# Altium footprint library SMDLibrary.PcbLib: 306 footprints (part 4 of 20)
Each footprint in its own frame and in the unit in brackets; x right, y up, seen from the top. Pads: shape width x height; smd on the part's side, far side on the other; paste and mask are expansions set on the pad; w line width, h text height; cw(c..) or ccw(c..) is an arc to the next point about the centre after c.
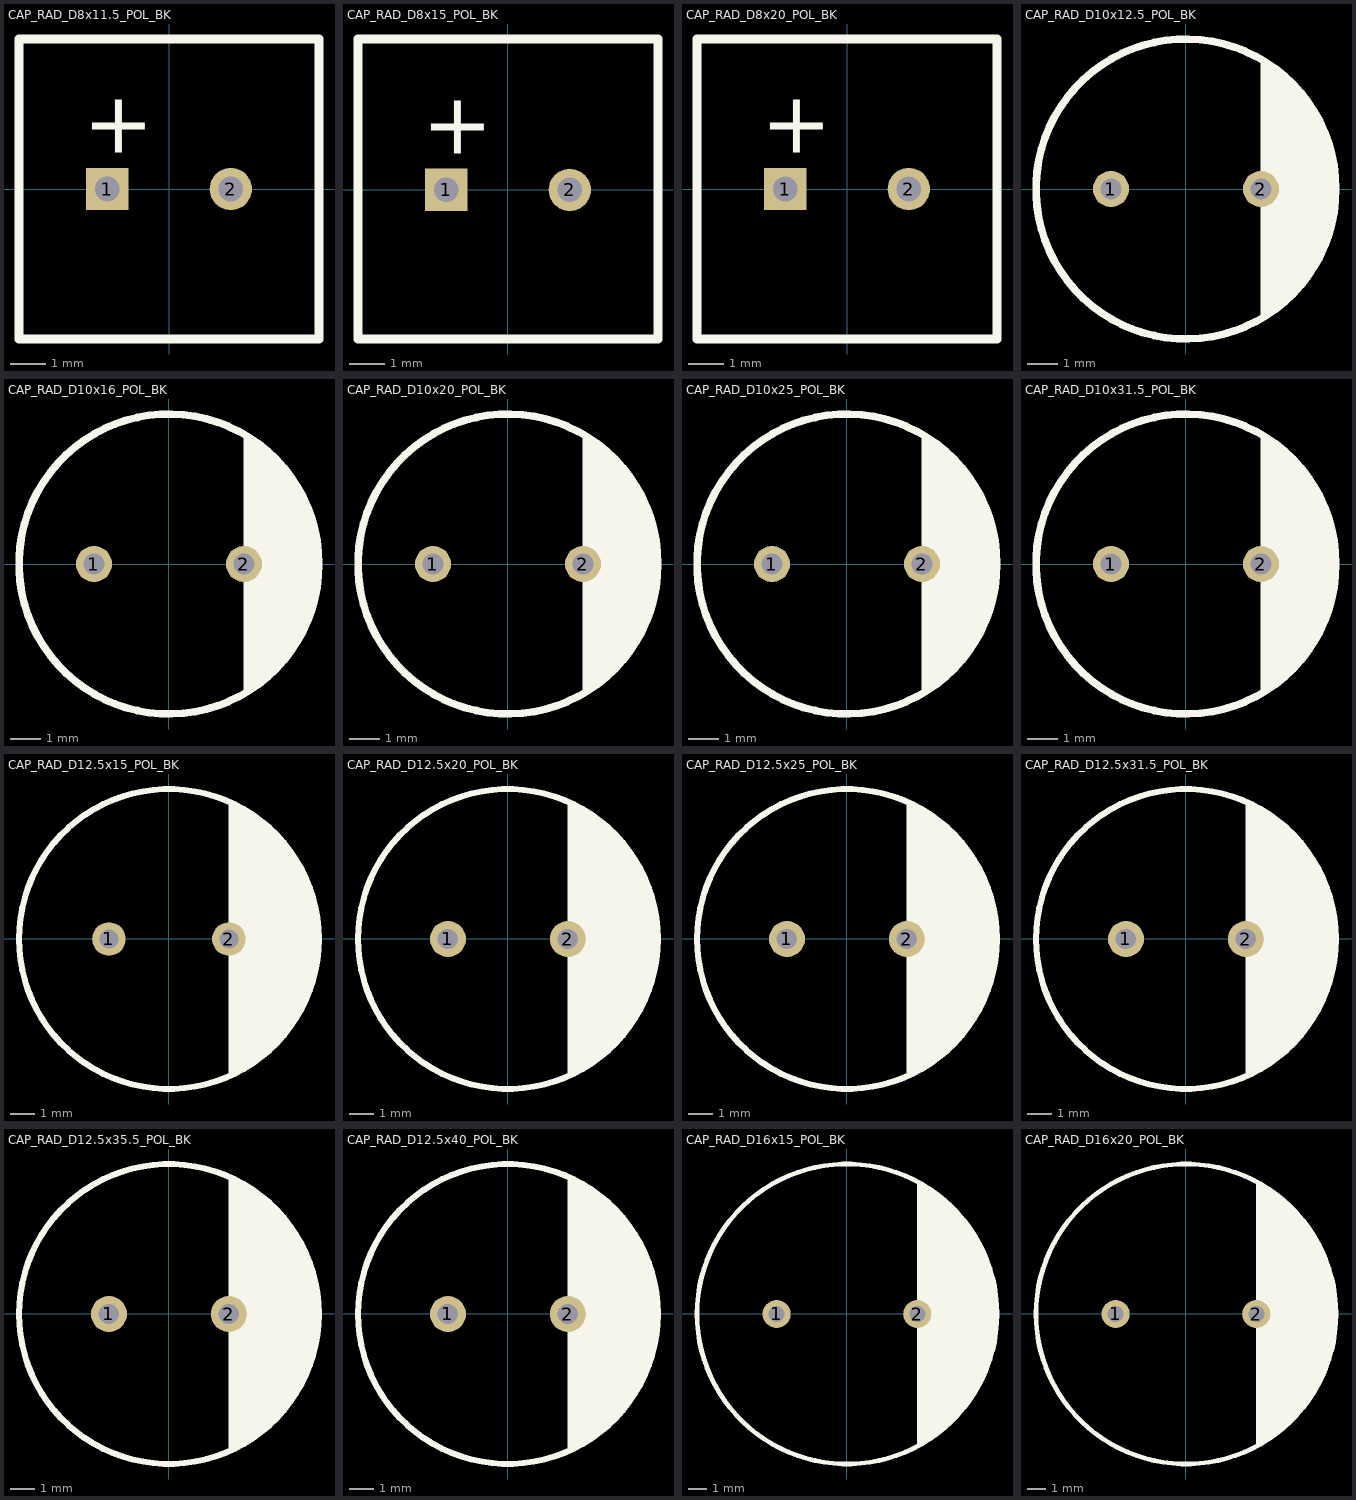
[diagram p3: the footprints below, top view; thin cyan lines are the x and y axes]

## CAP_RAD_D8x11.5_POL_BK [mm]
pads (2):
  rect 1.2x1.2 hole 0.7: 1(-1.75,0)
  round 1.2 hole 0.7: 2(1.75,0)
Top Overlay:
  region: 1.3,2.25
  lines w0.254: -4.25,-4.25 -4.25,4.25 4.25,4.25 4.25,-4.25 -4.25,-4.25
  text "+" at -2.425,0.45 h3
3D body "CAP_RAD_D8x11.5_POL_BK.stp": height 13, standoff -2.5, extent -4.25,-4.25 4.25,4.25

## CAP_RAD_D8x15_POL_BK [mm]
pads (2):
  rect 1.2x1.2 hole 0.7: 1(-1.75,0)
  round 1.2 hole 0.7: 2(1.75,0)
Top Overlay:
  region: 1.3,2.25
  lines w0.254: -4.25,-4.225 -4.25,4.275 4.25,4.275 4.25,-4.225 -4.25,-4.225
  text "+" at -2.425,0.45 h3
3D body "CAP_RAD_D8x15_POL_BK.stp": height 16.5, standoff -2.5, extent -4.25,-4.224 4.25,4.275

## CAP_RAD_D8x20_POL_BK [mm]
pads (2):
  rect 1.2x1.2 hole 0.7: 1(-1.75,0)
  round 1.2 hole 0.7: 2(1.75,0)
Top Overlay:
  region: 1.3,2.25
  lines w0.254: -4.25,-4.25 -4.25,4.25 4.25,4.25 4.25,-4.25 -4.25,-4.25
  text "+" at -2.425,0.45 h3
3D body "CAP_RAD_D8x20_POL_BK.stp": height 22, standoff -2.5, extent -4.25,-4.25 4.25,4.25

## CAP_RAD_D10x12.5_POL_BK [mm]
pads (2):
  round 1.2 hole 0.7: 1(-2.5,0) 2(2.5,0)
Top Overlay:
  circle w0.254: c0,0 r5
  region: 1.3,2.25
  region: 2.5,4.33 2.5,-4.299 2.78,-4.129 3.294,-3.721 3.752,-3.253 4.148,-2.73 4.475,-2.162 4.728,-1.557 4.903,-0.926 4.998,-0.277 5.004,0.051 4.995,0.374 4.897,1.015 4.72,1.637 4.466,2.233 4.139,2.792 3.744,3.305 3.288,3.765 2.778,4.164
3D body "CAP_RAD_D10x12.5_POL_BK.stp": height 14, standoff -2.5, extent -5.25,-5.247 5.25,5.248

## CAP_RAD_D10x16_POL_BK [mm]
pads (2):
  round 1.2 hole 0.7: 1(-2.5,0) 2(2.5,0)
Top Overlay:
  circle w0.254: c0,0 r5
  region: 2.5,4.33 2.5,-4.299 2.78,-4.129 3.294,-3.721 3.752,-3.253 4.148,-2.73 4.475,-2.162 4.728,-1.557 4.903,-0.926 4.998,-0.277 5.004,0.051 4.995,0.374 4.897,1.015 4.72,1.637 4.465,2.233 4.138,2.792 3.744,3.305 3.288,3.765 2.778,4.164
  region: 1.3,2.25
3D body "CAP_RAD_D10x16_POL_BK.stp": height 17.5, standoff -2.5, extent -5.25,-5.247 5.25,5.248

## CAP_RAD_D10x20_POL_BK [mm]
pads (2):
  round 1.2 hole 0.7: 1(-2.5,0) 2(2.5,0)
Top Overlay:
  circle w0.254: c0,0 r5
  region: 2.5,4.33 2.5,-4.299 2.78,-4.129 3.294,-3.721 3.752,-3.253 4.148,-2.73 4.475,-2.162 4.728,-1.557 4.903,-0.926 4.998,-0.277 5.004,0.051 4.995,0.374 4.897,1.015 4.72,1.637 4.465,2.233 4.138,2.792 3.744,3.305 3.288,3.765 2.778,4.164
  region: 1.3,2.25
3D body "CAP_RAD_D10x20_POL_BK.stp": height 22, standoff -2.5, extent -5.25,-5.247 5.25,5.248

## CAP_RAD_D10x25_POL_BK [mm]
pads (2):
  round 1.2 hole 0.7: 1(-2.5,0) 2(2.5,0)
Top Overlay:
  circle w0.254: c0,0 r5
  region: 1.3,2.25
  region: 2.5,4.33 2.5,-4.299 2.78,-4.129 3.294,-3.721 3.752,-3.253 4.148,-2.73 4.475,-2.162 4.728,-1.557 4.903,-0.926 4.998,-0.277 5.004,0.051 4.995,0.374 4.897,1.015 4.72,1.637 4.465,2.233 4.138,2.792 3.744,3.305 3.288,3.765 2.778,4.164
3D body "CAP_RAD_D10x25_POL_BK.stp": height 27, standoff -2.5, extent -5.25,-5.248 5.25,5.249

## CAP_RAD_D10x31.5_POL_BK [mm]
pads (2):
  round 1.2 hole 0.7: 1(-2.5,0) 2(2.5,0)
Top Overlay:
  circle w0.254: c0,0 r5
  region: 1.3,2.25
  region: 2.5,4.33 2.5,-4.299 2.78,-4.129 3.294,-3.721 3.752,-3.253 4.148,-2.73 4.475,-2.162 4.728,-1.557 4.903,-0.926 4.998,-0.277 5.004,0.051 4.995,0.374 4.897,1.015 4.72,1.637 4.465,2.233 4.138,2.792 3.744,3.305 3.288,3.765 2.778,4.164
3D body "CAP_RAD_D10x31.5_POL_BK.stp": height 33.5, standoff -2.5, extent -5.25,-5.247 5.25,5.247

## CAP_RAD_D12.5x15_POL_BK [mm]
pads (2):
  round 1.4 hole 0.8: 1(-2.5,0) 2(2.5,0)
Top Overlay:
  circle w0.254: c0,0 r6.25
  region: 2.5,5.74 2.5,-5.74 2.783,-5.627 3.322,-5.344 3.83,-5.008 4.3,-4.622 4.73,-4.19 5.113,-3.716 5.446,-3.206 5.725,-2.665 5.948,-2.098 6.112,-1.512 6.216,-0.912 6.258,-0.304 6.248,0 6.258,0.304 6.216,0.912 6.112,1.512 5.948,2.098 5.725,2.665 5.446,3.206 5.113,3.716 4.73,4.189 4.3,4.622 3.829,5.008 3.322,5.344 2.782,5.627
  region: 1.3,2.25
3D body "CAP_RAD_D12.5x15_POL_BK.stp": height 16.5, standoff -2.5, extent -6.5,-6.499 6.5,6.499

## CAP_RAD_D12.5x20_POL_BK [mm]
pads (2):
  round 1.5 hole 0.85: 1(-2.5,0) 2(2.5,0)
Top Overlay:
  circle w0.254: c0,0 r6.25
  region: 2.5,5.74 2.5,-5.74 2.783,-5.627 3.322,-5.344 3.83,-5.008 4.3,-4.622 4.73,-4.19 5.113,-3.716 5.446,-3.206 5.725,-2.665 5.948,-2.098 6.112,-1.512 6.216,-0.912 6.258,-0.304 6.248,0 6.258,0.304 6.216,0.912 6.112,1.512 5.948,2.098 5.725,2.665 5.446,3.206 5.113,3.716 4.73,4.189 4.3,4.622 3.829,5.008 3.322,5.344 2.782,5.627
  region: 1.3,2.25
3D body "CAP_RAD_D12.5x20_POL_BK.stp": height 22, standoff -2.5, extent -6.5,-6.499 6.5,6.499

## CAP_RAD_D12.5x25_POL_BK [mm]
pads (2):
  round 1.5 hole 0.85: 1(-2.5,0) 2(2.5,0)
Top Overlay:
  circle w0.254: c0,0 r6.25
  region: 1.3,2.25
  region: 2.5,5.74 2.5,-5.74 2.782,-5.627 3.322,-5.344 3.829,-5.008 4.3,-4.622 4.73,-4.19 5.113,-3.716 5.446,-3.206 5.725,-2.665 5.948,-2.098 6.112,-1.512 6.216,-0.912 6.258,-0.304 6.248,0 6.258,0.304 6.216,0.912 6.112,1.512 5.948,2.098 5.725,2.665 5.446,3.206 5.113,3.716 4.729,4.189 4.3,4.622 3.829,5.008 3.322,5.344 2.782,5.627
3D body "CAP_RAD_D12.5x25_POL_BK.stp": height 27, standoff -2.5, extent -6.5,-6.5 6.5,6.5

## CAP_RAD_D12.5x31.5_POL_BK [mm]
pads (2):
  round 1.5 hole 0.85: 1(-2.5,0) 2(2.5,0)
Top Overlay:
  circle w0.254: c0,0 r6.25
  region: 2.5,5.74 2.5,-5.74 2.782,-5.627 3.322,-5.344 3.829,-5.008 4.3,-4.622 4.73,-4.19 5.113,-3.716 5.446,-3.206 5.725,-2.665 5.948,-2.098 6.112,-1.512 6.216,-0.912 6.258,-0.304 6.248,0 6.258,0.304 6.216,0.912 6.112,1.512 5.948,2.098 5.725,2.665 5.446,3.206 5.113,3.716 4.729,4.189 4.3,4.622 3.829,5.008 3.322,5.344 2.782,5.627
  region: 1.3,2.25
3D body "CAP_RAD_D12.5x31.5_POL_BK.stp": height 33.5, standoff -2.5, extent -6.5,-6.498 6.5,6.499

## CAP_RAD_D12.5x35.5_POL_BK [mm]
pads (2):
  round 1.5 hole 0.85: 1(-2.5,0) 2(2.5,0)
Top Overlay:
  circle w0.254: c0,0 r6.25
  region: 1.3,2.25
  region: 2.5,5.74 2.5,-5.74 2.782,-5.627 3.322,-5.344 3.829,-5.008 4.3,-4.622 4.729,-4.19 5.112,-3.716 5.445,-3.206 5.725,-2.665 5.948,-2.098 6.112,-1.512 6.216,-0.912 6.258,-0.304 6.248,0 6.258,0.304 6.216,0.912 6.112,1.512 5.948,2.098 5.725,2.665 5.445,3.206 5.112,3.716 4.729,4.189 4.3,4.621 3.829,5.008 3.322,5.344 2.782,5.627
3D body "CAP_RAD_D12.5x35.5_POL_BK.stp": height 37.5, standoff -2.5, extent -6.5,-6.496 6.5,6.496

## CAP_RAD_D12.5x40_POL_BK [mm]
pads (2):
  round 1.5 hole 0.85: 1(-2.5,0) 2(2.5,0)
Top Overlay:
  circle w0.254: c0,0 r6.25
  region: 2.5,5.74 2.5,-5.74 2.782,-5.627 3.322,-5.344 3.829,-5.008 4.3,-4.622 4.729,-4.19 5.112,-3.716 5.445,-3.206 5.725,-2.665 5.948,-2.098 6.112,-1.512 6.216,-0.912 6.258,-0.304 6.248,0 6.258,0.304 6.216,0.912 6.112,1.512 5.948,2.098 5.725,2.665 5.445,3.206 5.112,3.716 4.729,4.189 4.3,4.621 3.829,5.008 3.322,5.344 2.782,5.627
  region: 1.3,2.25
3D body "CAP_RAD_D12.5x40_POL_BK.stp": height 42, standoff -2.5, extent -6.5,-6.496 6.5,6.496

## CAP_RAD_D16x15_POL_BK [mm]
pads (2):
  round 1.5 hole 0.85: 1(-3.75,0) 2(3.75,0)
Top Overlay:
  circle w0.254: c0,0 r8
  region: 3.75,7.094 3.75,-7.058 4.067,-6.882 4.669,-6.476 5.232,-6.019 5.754,-5.514 6.229,-4.965 6.653,-4.377 7.025,-3.753 7.34,-3.1 7.597,-2.421 7.793,-1.722 7.927,-1.009 7.997,-0.287 8.001,0.076 7.995,0.435 7.919,1.148 7.781,1.851 7.583,2.54 7.324,3.209 7.008,3.852 6.636,4.465 6.213,5.043 5.74,5.582 5.221,6.077 4.662,6.525 4.065,6.922
  region: 1.3,2.25
3D body "CAP_RAD_D16x15_POL_BK.stp": height 16.5, standoff -2.5, extent -8.25,-8.249 8.25,8.25

## CAP_RAD_D16x20_POL_BK [mm]
pads (2):
  round 1.5 hole 0.85: 1(-3.75,0) 2(3.75,0)
Top Overlay:
  circle w0.254: c0,0 r8
  region: 3.75,7.094 3.75,-7.058 4.067,-6.882 4.669,-6.476 5.232,-6.019 5.754,-5.514 6.229,-4.965 6.653,-4.377 7.025,-3.753 7.34,-3.1 7.597,-2.421 7.793,-1.722 7.927,-1.009 7.997,-0.287 8.001,0.076 7.995,0.435 7.919,1.148 7.781,1.851 7.583,2.54 7.324,3.209 7.008,3.852 6.636,4.465 6.213,5.043 5.74,5.582 5.221,6.077 4.662,6.525 4.065,6.922
  region: 1.3,2.25
3D body "CAP_RAD_D16x20_POL_BK.stp": height 22, standoff -2.5, extent -8.25,-8.249 8.25,8.25